# Altium footprint library hallglib.PcbLib: 98 footprints (part 5 of 7)
Each footprint in its own frame and in the unit in brackets; x right, y up, seen from the top. Pads: shape width x height; smd on the part's side, far side on the other; paste and mask are expansions set on the pad; w line width, h text height; cw(c..) or ccw(c..) is an arc to the next point about the centre after c.
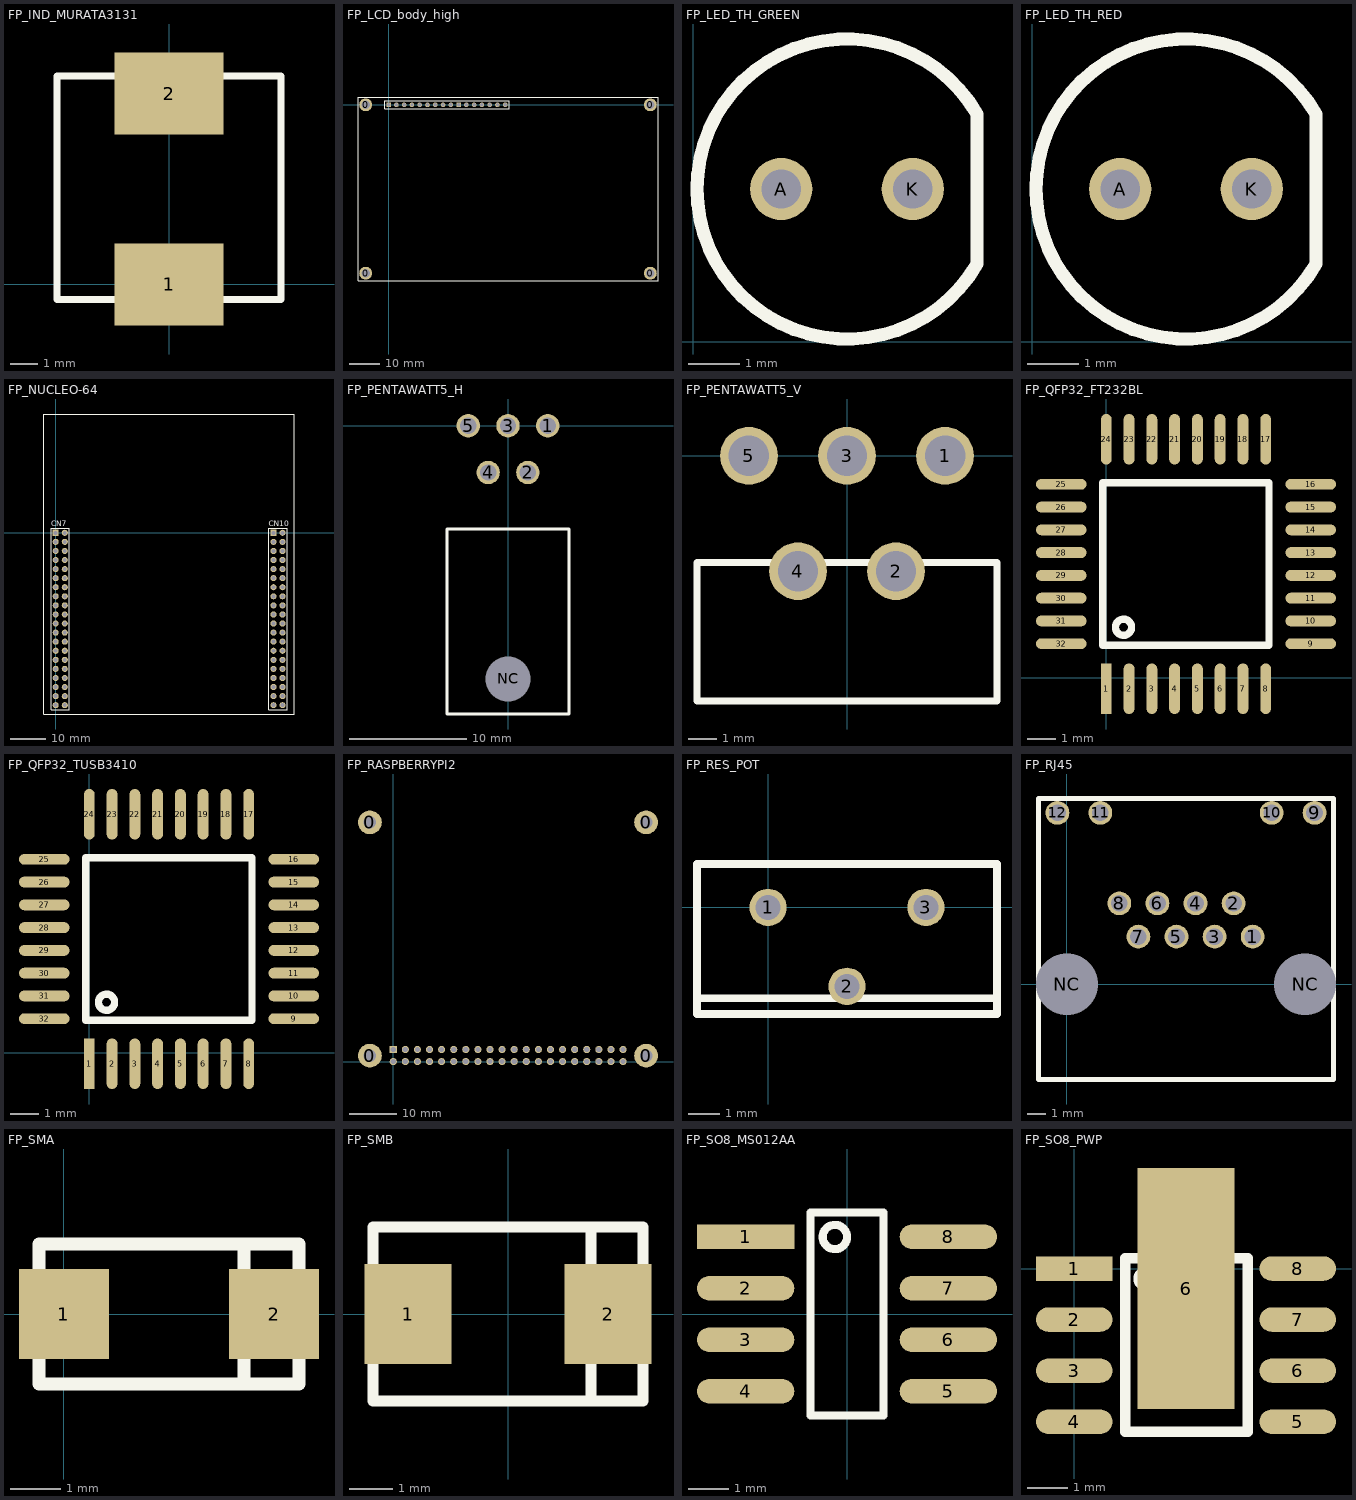
[diagram p4: the footprints below, top view; thin cyan lines are the x and y axes]

## FP_IND_MURATA3131 [mm] "Murata Chip Inductor LQH88P Series (3131 Size)"
height 4
pads (2):
  rect 4x3 smd: 1(0,0) 2(0,7)
Top Overlay:
  lines w0.254: -4.1,-0.55 4.1,-0.55 4.1,7.65 -4.1,7.65 -4.1,-0.55
3D body: height 0.3, standoff 0, extent -1.4,7.6 1.4,7.65
3D body: height 0.3, standoff 0, extent -1.4,-0.55 1.4,-0.5
3D body: height 2.8, standoff 1, extent -3.572,-0.043 3.6,7.143
3D body: height 3.8, standoff 2.8, extent -4,-0.5 4,7.6
3D body: height 1, standoff 0, extent -4,-0.5 4,7.6

## FP_LCD_body_high [mm]
pads (20):
  round 4.2 hole 2.7: 0(-7.5,-55) 0(-7.5,0) 0(85.5,-55) 0(85.5,0)
  rect 1.5x1.5 hole 1.1: 1(0,0) 10(22.86,0)
  round 1.5 hole 1.1: 2(2.54,0) 3(5.08,0) 4(7.62,0) 5(10.16,0) 6(12.7,0) 7(15.24,0) 8(17.78,0) 9(20.32,0) 11(25.4,0) 12(27.94,0) 13(30.48,0) 14(33.02,0) 15(35.56,0) 16(38.1,0)
Top Overlay:
  lines w0.254: -10,-57.5 88,-57.5 88,2.5 -10,2.5 -10,-57.5 ; -1.27,-1.27 39.37,-1.27 39.37,1.27 -1.27,1.27 -1.27,-1.27
3D body: height 9.95, standoff 9.9, extent 71.25,-38.9 74.2,-34.15
3D body: height 9.95, standoff 9.9, extent 71.25,-33.55 74.2,-28.8
3D body: height 9.95, standoff 9.9, extent 71.25,-28.2 74.2,-23.45
3D body: height 9.95, standoff 9.9, extent 71.25,-22.85 74.2,-18.1
3D body: height 9.95, standoff 9.9, extent 67.7,-38.9 70.65,-34.15
3D body: height 9.95, standoff 9.9, extent 67.7,-33.55 70.65,-28.8
3D body: height 9.95, standoff 9.9, extent 67.7,-28.2 70.65,-23.45
3D body: height 9.95, standoff 9.9, extent 67.7,-22.85 70.65,-18.1
3D body: height 9.95, standoff 9.9, extent 64.15,-38.9 67.1,-34.15
3D body: height 9.95, standoff 9.9, extent 64.15,-33.55 67.1,-28.8
3D body: height 9.95, standoff 9.9, extent 64.15,-28.2 67.1,-23.45
3D body: height 9.95, standoff 9.9, extent 64.15,-22.85 67.1,-18.1
3D body: height 9.95, standoff 9.9, extent 60.6,-38.9 63.55,-34.15
3D body: height 9.95, standoff 9.9, extent 60.6,-33.55 63.55,-28.8
3D body: height 9.95, standoff 9.9, extent 60.6,-28.2 63.55,-23.45
3D body: height 9.95, standoff 9.9, extent 60.6,-22.85 63.55,-18.1
3D body: height 9.95, standoff 9.9, extent 57.05,-38.9 60,-34.15
3D body: height 9.95, standoff 9.9, extent 57.05,-33.55 60,-28.8
3D body: height 9.95, standoff 9.9, extent 57.05,-28.2 60,-23.45
3D body: height 9.95, standoff 9.9, extent 57.05,-22.85 60,-18.1
3D body: height 9.95, standoff 9.9, extent 53.5,-38.9 56.45,-34.15
3D body: height 9.95, standoff 9.9, extent 53.5,-33.55 56.45,-28.8
3D body: height 9.95, standoff 9.9, extent 53.5,-28.2 56.45,-23.45
3D body: height 9.95, standoff 9.9, extent 53.5,-22.85 56.45,-18.1
3D body: height 9.95, standoff 9.9, extent 49.95,-38.9 52.9,-34.15
3D body: height 9.95, standoff 9.9, extent 49.95,-33.55 52.9,-28.8
3D body: height 9.95, standoff 9.9, extent 49.95,-28.2 52.9,-23.45
3D body: height 9.95, standoff 9.9, extent 49.95,-22.85 52.9,-18.1
3D body: height 9.95, standoff 9.9, extent 46.4,-38.9 49.35,-34.15
3D body: height 9.95, standoff 9.9, extent 46.4,-33.55 49.35,-28.8
3D body: height 9.95, standoff 9.9, extent 46.4,-28.2 49.35,-23.45
3D body: height 9.95, standoff 9.9, extent 46.4,-22.85 49.35,-18.1
3D body: height 9.95, standoff 9.9, extent 42.85,-38.9 45.8,-34.15
3D body: height 9.95, standoff 9.9, extent 42.85,-33.55 45.8,-28.8
3D body: height 9.95, standoff 9.9, extent 42.85,-28.2 45.8,-23.45
3D body: height 9.95, standoff 9.9, extent 42.85,-22.85 45.8,-18.1
3D body: height 9.95, standoff 9.9, extent 39.3,-38.9 42.25,-34.15
3D body: height 9.95, standoff 9.9, extent 39.3,-33.55 42.25,-28.8
3D body: height 9.95, standoff 9.9, extent 39.3,-28.2 42.25,-23.45
3D body: height 9.95, standoff 9.9, extent 39.3,-22.85 42.25,-18.1
3D body: height 9.95, standoff 9.9, extent 35.75,-38.9 38.7,-34.15
3D body: height 9.95, standoff 9.9, extent 35.75,-33.55 38.7,-28.8
3D body: height 9.95, standoff 9.9, extent 35.75,-28.2 38.7,-23.45
3D body: height 9.95, standoff 9.9, extent 35.75,-22.85 38.7,-18.1
3D body: height 9.95, standoff 9.9, extent 32.2,-38.9 35.15,-34.15
3D body: height 9.95, standoff 9.9, extent 32.2,-33.55 35.15,-28.8
3D body: height 9.95, standoff 9.9, extent 32.2,-28.2 35.15,-23.45
3D body: height 9.95, standoff 9.9, extent 32.2,-22.85 35.15,-18.1
3D body: height 9.95, standoff 9.9, extent 28.65,-38.9 31.6,-34.15
3D body: height 9.95, standoff 9.9, extent 28.65,-33.55 31.6,-28.8
3D body: height 9.95, standoff 9.9, extent 28.65,-28.2 31.6,-23.45
3D body: height 9.95, standoff 9.9, extent 28.65,-22.85 31.6,-18.1
3D body: height 9.95, standoff 9.9, extent 25.1,-38.9 28.05,-34.15
3D body: height 9.95, standoff 9.9, extent 25.1,-33.55 28.05,-28.8
3D body: height 9.95, standoff 9.9, extent 25.1,-28.2 28.05,-23.45
3D body: height 9.95, standoff 9.9, extent 25.1,-22.85 28.05,-18.1
3D body: height 9.95, standoff 9.9, extent 21.55,-38.9 24.5,-34.15
3D body: height 9.95, standoff 9.9, extent 21.55,-33.55 24.5,-28.8
3D body: height 9.95, standoff 9.9, extent 21.55,-28.2 24.5,-23.45
3D body: height 9.95, standoff 9.9, extent 21.55,-22.85 24.5,-18.1
3D body: height 9.95, standoff 9.9, extent 18,-38.9 20.95,-34.15
3D body: height 9.95, standoff 9.9, extent 18,-33.55 20.95,-28.8
3D body: height 9.95, standoff 9.9, extent 18,-28.2 20.95,-23.45
3D body: height 9.95, standoff 9.9, extent 18,-22.85 20.95,-18.1
3D body: height 9.95, standoff 9.9, extent 14.45,-38.9 17.4,-34.15
3D body: height 9.95, standoff 9.9, extent 14.45,-33.55 17.4,-28.8
3D body: height 9.95, standoff 9.9, extent 14.45,-28.2 17.4,-23.45
3D body: height 9.95, standoff 9.9, extent 14.45,-22.85 17.4,-18.1
3D body: height 9.95, standoff 9.9, extent 10.9,-38.9 13.85,-34.15
3D body: height 9.95, standoff 9.9, extent 10.9,-33.55 13.85,-28.8
3D body: height 9.95, standoff 9.9, extent 10.9,-28.2 13.85,-23.45
3D body: height 9.95, standoff 9.9, extent 10.9,-22.85 13.85,-18.1
3D body: height 9.95, standoff 9.9, extent 7.35,-38.9 10.3,-34.15
3D body: height 9.95, standoff 9.9, extent 7.35,-33.55 10.3,-28.8
3D body: height 9.95, standoff 9.9, extent 7.35,-28.2 10.3,-23.45
3D body: height 9.95, standoff 9.9, extent 7.35,-22.85 10.3,-18.1
3D body: height 9.95, standoff 9.9, extent 3.8,-38.9 6.75,-34.15
3D body: height 9.95, standoff 9.9, extent 3.8,-33.55 6.75,-28.8
3D body: height 9.95, standoff 9.9, extent 3.8,-28.2 6.75,-23.45
3D body: height 9.95, standoff 9.9, extent 3.8,-22.85 6.75,-18.1
3D body: height 10, standoff 5, extent 1,-41.1 77,-15.9
3D body: height 10, standoff 5, extent 77,-49.5 88,-7.5
3D body: height 10, standoff 5, extent 1,-49.5 77,-41.1
3D body: height 10, standoff 5, extent 1,-15.9 77,-7.5
3D body: height 10, standoff 5, extent -10,-49.5 1,-7.5
3D body: height 5.05, standoff 3.35, extent -8.75,-56.248 -6.26,-53.752
3D body: height 5.05, standoff 3.35, extent -8.75,-1.248 -6.26,1.248
3D body: height 5.05, standoff 3.35, extent 84.25,-1.248 86.74,1.248
3D body: height 5.05, standoff 3.35, extent 84.25,-56.248 86.74,-53.752
3D body: height 5.05, standoff 3.35, extent -0.55,-0.548 0.546,0.55
3D body: height 5.05, standoff 3.35, extent 1.99,-0.548 3.086,0.55
3D body: height 5.05, standoff 3.35, extent 4.53,-0.548 5.626,0.55
3D body: height 5.05, standoff 3.35, extent 7.07,-0.548 8.166,0.55
3D body: height 5.05, standoff 3.35, extent 9.61,-0.548 10.706,0.55
3D body: height 5.05, standoff 3.35, extent 12.15,-0.548 13.246,0.55
3D body: height 5.05, standoff 3.35, extent 14.69,-0.548 15.786,0.55
3D body: height 5.05, standoff 3.35, extent 17.23,-0.548 18.326,0.55
3D body: height 5.05, standoff 3.35, extent 19.77,-0.548 20.866,0.55
3D body: height 5.05, standoff 3.35, extent 22.31,-0.548 23.406,0.55
3D body: height 5.05, standoff 3.35, extent 24.85,-0.548 25.946,0.55
3D body: height 5.05, standoff 3.35, extent 27.39,-0.548 28.486,0.55
3D body: height 5.05, standoff 3.35, extent 29.93,-0.548 31.026,0.55
3D body: height 5.05, standoff 3.35, extent 32.47,-0.548 33.566,0.55
3D body: height 5.05, standoff 3.35, extent 35.01,-0.548 36.106,0.55
3D body: height 5.05, standoff 3.35, extent 37.55,-0.548 38.646,0.55
3D body: height 5, standoff 0.4, extent -6,-11 84,-10
3D body: height 5, standoff 0.4, extent -6,-46.95 84,-45.95
3D body: height 5, standoff 3.4, extent -10,-57.5 88,2.5

## FP_LED_TH_GREEN [mm]
pads (2):
  round 1.2 hole 0.762: A(1.7,2.95) K(4.24,2.95)
Top Overlay:
  lines w0.254: 5.478,1.502 cw(c2.97,2.95) 5.478,4.398 5.478,1.502
3D body "corto_green.step": height 10.25, standoff -5, extent 0,0 5.45,5.9

## FP_LED_TH_RED [mm]
pads (2):
  round 1.2 hole 0.762: A(1.7,2.95) K(4.24,2.95)
Top Overlay:
  lines w0.254: 5.478,1.502 cw(c2.97,2.95) 5.478,4.398 5.478,1.502
3D body "corto_red.step": height 10.25, standoff -5, extent 0,0 5.45,5.9

## FP_NUCLEO-64 [mm]
height 11
pads (80):
  round 1.7 hole 1.1: 0(0,-48.26) 0(2.54,-48.26) 0(60.96,-48.26) 0(63.5,-48.26) 2(2.54,0) 3(0,-2.54) 4(2.54,-2.54) 5(0,-5.08) 6(2.54,-5.08) 7(0,-7.62) 8(2.54,-7.62) 9(0,-10.16) 10(2.54,-10.16) 11(0,-12.7) 12(2.54,-12.7) 13(0,-15.24) 14(2.54,-15.24) 15(0,-17.78) 16(2.54,-17.78) 17(0,-20.32) 18(2.54,-20.32) 19(0,-22.86) 20(2.54,-22.86) 21(0,-25.4) 22(2.54,-25.4) 23(0,-27.94) 24(2.54,-27.94) 25(0,-30.48) 26(2.54,-30.48) 27(0,-33.02) 28(2.54,-33.02) 29(0,-35.56) 30(2.54,-35.56) 31(0,-38.1) 32(2.54,-38.1) 33(0,-40.64) 34(2.54,-40.64) 35(0,-43.18) 36(2.54,-43.18) 37(0,-45.72) 38(2.54,-45.72) 40(63.5,0) 41(60.96,-2.54) 42(63.5,-2.54) 43(60.96,-5.08) 44(63.5,-5.08) 45(60.96,-7.62) 46(63.5,-7.62) 47(60.96,-10.16) 48(63.5,-10.16) 49(60.96,-12.7) 50(63.5,-12.7) 51(60.96,-15.24) 52(63.5,-15.24) 53(60.96,-17.78) 54(63.5,-17.78) 55(60.96,-20.32) 56(63.5,-20.32) 57(60.96,-22.86) 58(63.5,-22.86) 59(60.96,-25.4) 60(63.5,-25.4) 61(60.96,-27.94) 62(63.5,-27.94) 63(60.96,-30.48) 64(63.5,-30.48) 65(60.96,-33.02) 66(63.5,-33.02) 67(60.96,-35.56) 68(63.5,-35.56) 69(60.96,-38.1) 70(63.5,-38.1) 71(60.96,-40.64) 72(63.5,-40.64) 73(60.96,-43.18) 74(63.5,-43.18) 75(60.96,-45.72) 76(63.5,-45.72)
  rect 1.7x1.7 hole 1.1: 1(0,0) 39(60.96,0)
Top Overlay:
  lines w0.2: -1.27,-49.5 3.81,-49.5 3.81,1.27 -1.27,1.27 -1.27,-49.5 ; 59.69,-49.5 64.77,-49.5 64.77,1.27 59.69,1.27 59.69,-49.5
  lines w0.254: -3.3,-50.725 -3.3,33.25 66.725,33.25 66.725,-50.725 -3.3,-50.725
  text "CN10" at 59.69,1.778 h1.52
  text "CN7" at -1.27,1.778 h1.52
3D body: height 10, standoff 0, extent 59.691,-46.989 64.769,1.269
3D body: height 10, standoff 0, extent -1.269,-46.989 3.809,1.269
3D body: height 11, standoff 10, extent -3.299,-50.724 66.724,33.249

## FP_PENTAWATT5_H [mm] "Pentawatt 5 lead trough hole, horisontal mount"
height 4.8
pads (6):
  round 2 hole 1.4: 1(3.4,0) 2(1.7,-4) 3(0,0) 4(-1.7,-4) 5(-3.4,0)
  round 2 hole 3.85: NC(0,-21.65)
Top Overlay:
  lines w0.254: -5.2,-24.65 -5.2,-8.85 5.2,-8.85 5.2,-24.65 -5.2,-24.65
3D body "PENTAWATT5-HOROZONTAL.STEP": height 4.5, standoff -5.4, extent -5.2,-21.782 5.2,0.268

## FP_PENTAWATT5_V [mm] "Pentawatt 5 lead trough hole, vertical mount"
height 21.15
pads (5):
  round 2 hole 1.4: 1(3.4,0) 2(1.7,-4) 3(0,0) 4(-1.7,-4) 5(-3.4,0)
Top Overlay:
  lines w0.254: -5.2,-8.5 -5.2,-3.7 5.2,-3.7 5.2,-8.5 -5.2,-8.5
3D body "PENTAWATT5.STEP": height 21.08, standoff -4.22, extent -5.2,-7.9 5.2,0.174

## FP_QFP32_FT232BL [mil] "FTDI USB-UART atalakito"
height 62.99
pads (32):
  rect 15x70 smd: 1(0,-15)
  oval 15x70 smd: 2(31.5,-15) 3(62.99,-15) 4(94.49,-15) 5(125.98,-15) 6(157.48,-15) 7(188.98,-15) 8(220.47,-15) 17(220.47,329.96) 18(188.98,329.96) 19(157.48,329.96) 20(125.98,329.96) 21(94.49,329.96) 22(62.99,329.96) 23(31.5,329.96) 24(0,329.96)
  oval 70x15 smd paste+0: 9(282.72,47.24) 10(282.72,78.74) 11(282.72,110.24) 12(282.72,141.73) 13(282.72,173.23) 14(282.72,204.72) 15(282.72,236.22) 16(282.72,267.72)
  oval 70x15 smd: 25(-62.24,267.72) 26(-62.24,236.22) 27(-62.24,204.72) 28(-62.24,173.23) 29(-62.24,141.73) 30(-62.24,110.24) 31(-62.24,78.74) 32(-62.24,47.24)
Top Overlay:
  circle w10: c23.82,70 r11.18
  lines w10: -5,45 225,45 225,270 -5,270 -5,45
3D body "QFP32_ST-32-2.STEP": height 68.9, standoff 0, extent -67.35,-20.09 287.81,335.06

## FP_QFP32_TUSB3410 [mil] "TI TUSB3410 USB-UART atalakito MO-135 tok"
height 57.09
pads (32):
  rect 15x70 smd: 1(0,-15)
  oval 15x70 smd: 2(31.5,-15) 3(62.99,-15) 4(94.49,-15) 5(125.98,-15) 6(157.48,-15) 7(188.98,-15) 8(220.47,-15) 17(220.47,329.96) 18(188.98,329.96) 19(157.48,329.96) 20(125.98,329.96) 21(94.49,329.96) 22(62.99,329.96) 23(31.5,329.96) 24(0,329.96)
  oval 70x15 smd paste+0: 9(282.72,47.24) 10(282.72,78.74) 11(282.72,110.24) 12(282.72,141.73) 13(282.72,173.23) 14(282.72,204.72) 15(282.72,236.22) 16(282.72,267.72)
  oval 70x15 smd: 25(-62.24,267.72) 26(-62.24,236.22) 27(-62.24,204.72) 28(-62.24,173.23) 29(-62.24,141.73) 30(-62.24,110.24) 31(-62.24,78.74) 32(-62.24,47.24)
Top Overlay:
  circle w10: c23.82,70 r11.18
  lines w10: -5,45 -5,270 225,270 225,45 -5,45
3D body "QFP32_MO-135.STEP": height 62.99, standoff 0, extent -67.35,-20.09 287.81,335.06

## FP_RASPBERRYPI2 [mm] "Raspberry Pi 2"
pads (44):
  round 5 hole 2.6: 0(-4.9,1.25) 0(-4.9,50.25) 0(53.1,1.25) 0(53.1,50.25)
  rect 1.5x1.5 hole 1.1: 1(0,2.54)
  round 1.5 hole 1.1: 2(0,0) 3(2.54,2.54) 4(2.54,0) 5(5.08,2.54) 6(5.08,0) 7(7.62,2.54) 8(7.62,0) 9(10.16,2.54) 10(10.16,0) 11(12.7,2.54) 12(12.7,0) 13(15.24,2.54) 14(15.24,0) 15(17.78,2.54) 16(17.78,0) 17(20.32,2.54) 18(20.32,0) 19(22.86,2.54) 20(22.86,0) 21(25.4,2.54) 22(25.4,0) 23(27.94,2.54) 24(27.94,0) 25(30.48,2.54) 26(30.48,0) 27(33.02,2.54) 28(33.02,0) 29(35.56,2.54) 30(35.56,0) 31(38.1,2.54) 32(38.1,0) 33(40.64,2.54) 34(40.64,0) 35(43.18,2.54) 36(43.18,0) 37(45.72,2.54) 38(45.72,0) 39(48.26,2.54) 40(48.26,0)
3D body "Raspberry_Pi_Model_B+_3D_Assy.STEP": height 13.87, standoff -5.53, extent -8.001,-2.413 79.149,56.087
3D body: height 9, standoff 0, extent -1.27,-1.27 50.165,3.81
3D body: height 0, standoff -3.2, extent -0.325,2.34 0.325,2.74
3D body: height 0, standoff -3.2, extent 2.215,2.34 2.865,2.74
3D body: height 0, standoff -3.2, extent 4.755,2.34 5.405,2.74
3D body: height 0, standoff -3.2, extent 7.295,2.34 7.945,2.74
3D body: height 0, standoff -3.2, extent 9.835,2.34 10.485,2.74
3D body: height 0, standoff -3.2, extent 12.375,2.34 13.025,2.74
3D body: height 0, standoff -3.2, extent 14.915,2.34 15.565,2.74
3D body: height 0, standoff -3.2, extent 17.455,2.34 18.105,2.74
3D body: height 0, standoff -3.2, extent 19.995,2.34 20.645,2.74
3D body: height 0, standoff -3.2, extent 22.535,2.34 23.185,2.74
3D body: height 0, standoff -3.2, extent 25.075,2.34 25.725,2.74
3D body: height 0, standoff -3.2, extent 27.615,2.34 28.265,2.74
3D body: height 0, standoff -3.2, extent 30.155,2.34 30.805,2.74
3D body: height 0, standoff -3.2, extent 32.695,2.34 33.345,2.74
3D body: height 0, standoff -3.2, extent 35.235,2.34 35.885,2.74
3D body: height 0, standoff -3.2, extent 37.775,2.34 38.425,2.74
3D body: height 0, standoff -3.2, extent 40.315,2.34 40.965,2.74
3D body: height 0, standoff -3.2, extent 42.855,2.34 43.505,2.74
3D body: height 0, standoff -3.2, extent 45.395,2.34 46.045,2.74
3D body: height 0, standoff -3.2, extent 47.935,2.34 48.585,2.74
3D body: height 0, standoff -3.2, extent -0.325,-0.2 0.325,0.2
3D body: height 0, standoff -3.2, extent 2.215,-0.2 2.865,0.2
3D body: height 0, standoff -3.2, extent 4.755,-0.2 5.405,0.2
3D body: height 0, standoff -3.2, extent 7.295,-0.2 7.945,0.2
3D body: height 0, standoff -3.2, extent 9.835,-0.2 10.485,0.2
3D body: height 0, standoff -3.2, extent 12.375,-0.2 13.025,0.2
3D body: height 0, standoff -3.2, extent 14.915,-0.2 15.565,0.2
3D body: height 0, standoff -3.2, extent 17.455,-0.2 18.105,0.2
3D body: height 0, standoff -3.2, extent 19.995,-0.2 20.645,0.2
3D body: height 0, standoff -3.2, extent 22.535,-0.2 23.185,0.2
3D body: height 0, standoff -3.2, extent 25.075,-0.2 25.725,0.2
3D body: height 0, standoff -3.2, extent 27.615,-0.2 28.265,0.2
3D body: height 0, standoff -3.2, extent 30.155,-0.2 30.805,0.2
3D body: height 0, standoff -3.2, extent 32.695,-0.2 33.345,0.2
3D body: height 0, standoff -3.2, extent 35.235,-0.2 35.885,0.2
3D body: height 0, standoff -3.2, extent 37.775,-0.2 38.425,0.2
3D body: height 0, standoff -3.2, extent 40.315,-0.2 40.965,0.2
3D body: height 0, standoff -3.2, extent 42.855,-0.2 43.505,0.2
3D body: height 0, standoff -3.2, extent 45.395,-0.2 46.045,0.2
3D body: height 0, standoff -3.2, extent 47.935,-0.2 48.585,0.2

## FP_RES_POT [mm] "BOURNS - 3386H-1-103LF - TRIMMER, 10K"
height 9.525
pads (3):
  round 1.2 hole 0.8: 1(0,0) 2(2.54,-2.54) 3(5.08,0)
Top Overlay:
  lines w0.254: -2.286,-2.921 7.366,-2.921 ; -2.286,-3.429 -2.286,1.397 7.366,1.397 7.366,-3.429 -2.286,-3.429
3D body: height 0, standoff -2, extent 2.14,-2.94 2.937,-2.142
3D body: height 0, standoff -2, extent 4.68,-0.4 5.477,0.398
3D body: height 0, standoff -2, extent -0.4,-0.4 0.397,0.398
3D body: height 6.93, standoff 3.73, extent 0.946,-3.55 4.134,-3.45
3D body: height 9.53, standoff 0, extent -1.777,-3.441 7.873,1.409

## FP_RJ45 [mil] "AMPHENOL RJHS-508X"
height 520
pads (14):
  round 50 hole 35: 1(390,100) 2(350,170) 3(310,100) 4(270,170) 5(230,100) 6(190,170) 7(150,100) 8(110,170) 9(520,360) 10(430,360) 11(70,360) 12(-20,360)
  round 110 hole 130 unplated: NC(0,0) NC(500,0)
Top Overlay:
  lines w10: -60,-200 560,-200 560,390 -60,390 -60,-200
3D body "RJ45_rjhs5384-amphenol.STEP": height 580.87, standoff -144.88, extent -78.88,-234.77 579,405

## FP_SMA [mm] "SMA DO-214AC tok"
height 2.2
pads (2):
  rect 1.8x1.8 smd: 1(0,0) 2(4.2,0)
Top Overlay:
  lines w0.254: 3.6,-1.4 3.6,1.4 ; -0.5,-1.4 4.7,-1.4 4.7,1.4 -0.5,1.4 -0.5,-1.4
3D body "SMA.STEP": height 2.42, standoff 0.02, extent -0.5,-1.3 4.7,1.3

## FP_SMB [mm] "DO214-AA tok (SMB)"
height 2.5
pads (2):
  rect 2x2.3 smd: 1(-2.3,0) 2(2.3,0)
Top Overlay:
  lines w0.254: 1.905,-2 1.905,2 ; 3.1,2 -3.1,2 -3.1,-2 3.1,-2 3.1,2 ; 3.1,2 3.1,2
3D body "DO-214AA SMB.STEP": height 2.32, standoff 0.02, extent -2.7,-1.8 2.7,1.8

## FP_SO8_MS012AA [mm] "SO8 JEDEC MS-012AA, Analog Devices R-8, SO8-SOT96-1, NS M08A"
height 1.75
pads (8):
  rect 2.4x0.6 smd: 1(-2.5,1.905)
  oval 2.4x0.6 smd: 2(-2.5,0.635) 3(-2.5,-0.635) 4(-2.5,-1.905) 5(2.5,-1.905) 6(2.5,-0.635) 7(2.5,0.635) 8(2.5,1.905)
Top Overlay:
  circle w0.2: c-0.3,1.9 r0.3
  lines w0.2: -0.9,-2.5 -0.9,2.5 0.9,2.5 0.9,-2.5 -0.9,-2.5
3D body "SO8_MS012AA.STEP": height 1.9, standoff 0, extent -3.028,-2.5 3.028,2.5

## FP_SO8_PWP [mil] "SOIC8 powerpad tok"
height 78.74
pads (9):
  rect 75x24 smd: 1(0,0)
  oval 75x24 smd: 2(0,-50) 3(0,-100) 4(0,-150) 5(219,-150) 6(219,-100) 7(219,-50) 8(219,0)
  rect 94.88x236.22 smd: 6(109.53,-19.68)
Top Overlay:
  circle w10: c70,-10 r7.07
  lines w10: 50,-160 169.94,-160 169.94,10 50.06,10 50.06,-129.94 50,-130 50,-160
3D body "SOIC-8.STEP": height 68.9, standoff 0.01, extent -8.1,-173.23 228.58,23.62